# Altium footprint library Selex_PCBLib.PcbLib: 388 footprints (part 18 of 25)
Each footprint in its own frame and in the unit in brackets; x right, y up, seen from the top. Pads: shape width x height; smd on the part's side, far side on the other; paste and mask are expansions set on the pad; w line width, h text height; cw(c..) or ccw(c..) is an arc to the next point about the centre after c.
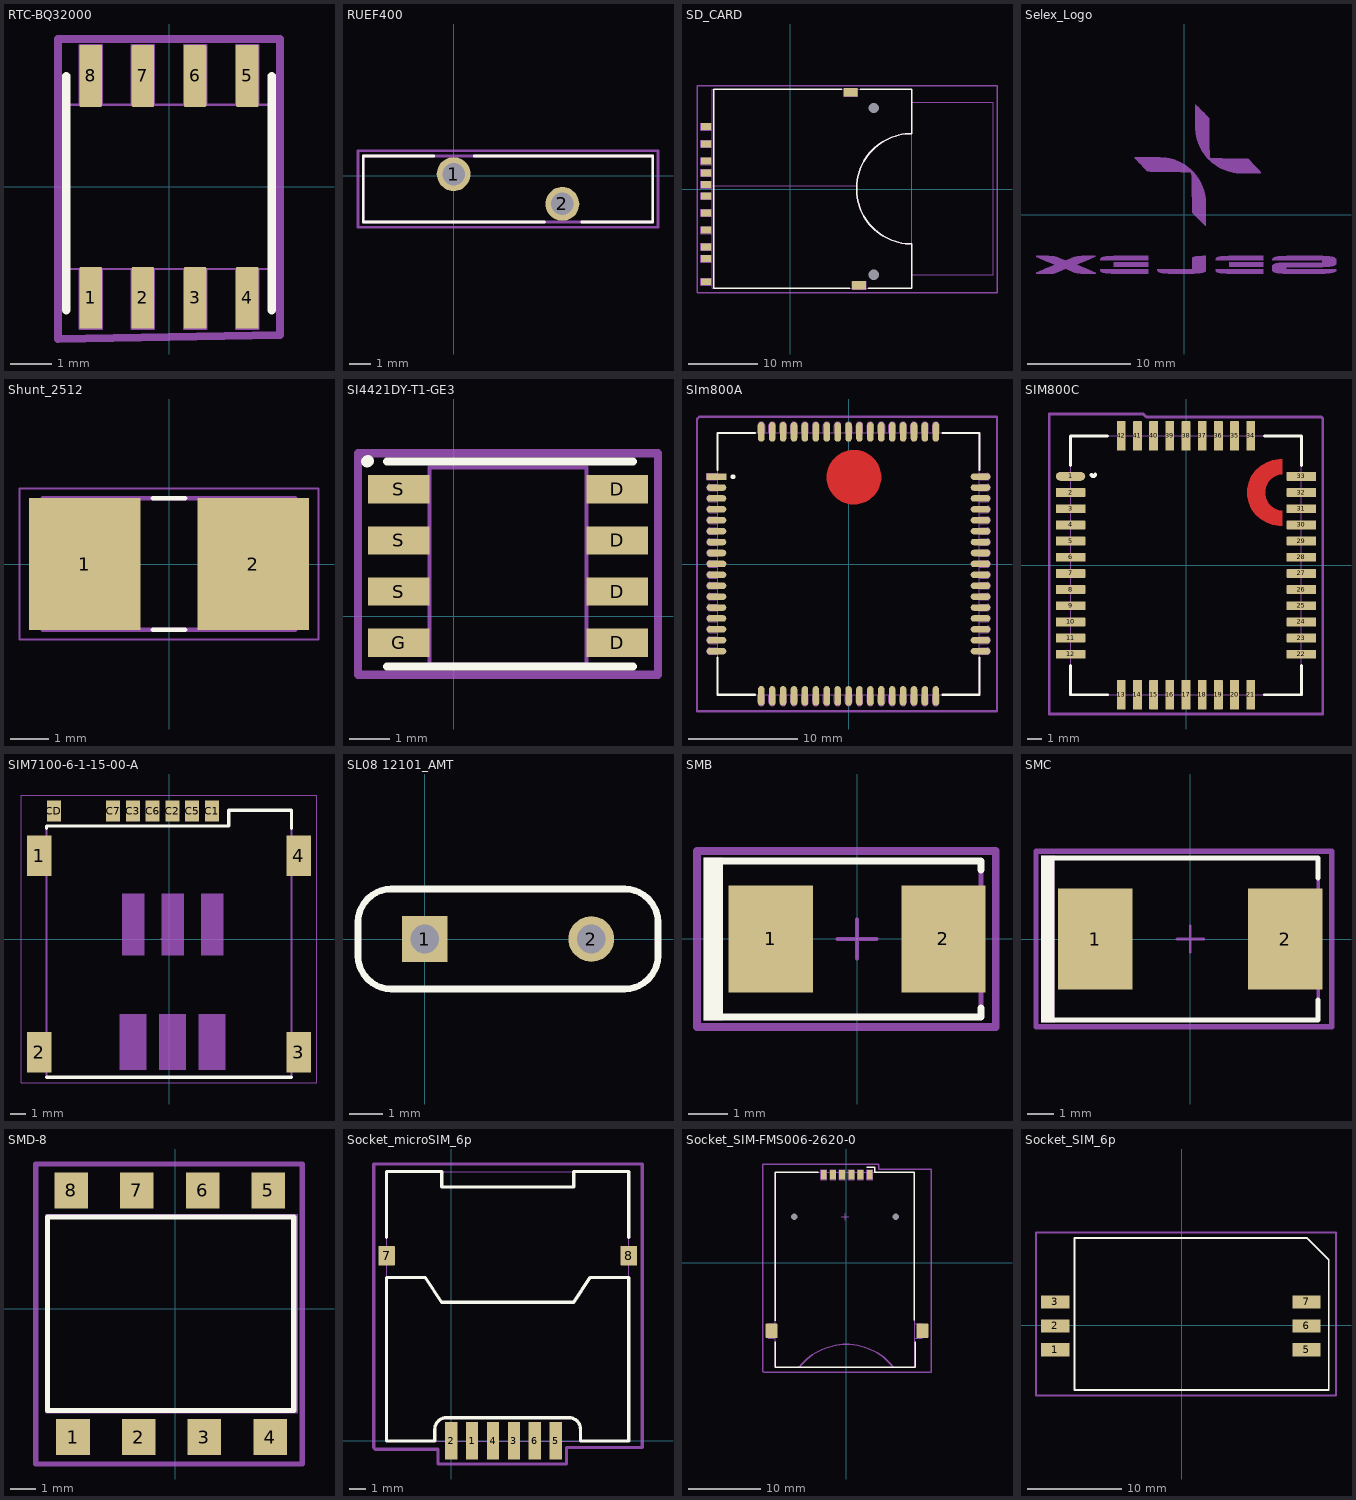
[diagram p17: the footprints below, top view; thin cyan lines are the x and y axes]

## RTC-BQ32000 [mm] "8-SOIC"
height 1.75
pads (8):
  rrect10% 0.55x1.5 smd mask+0.1: 1(-1.905,-2.7) 2(-0.635,-2.7) 3(0.635,-2.7) 4(1.905,-2.7) 5(1.905,2.7) 6(0.635,2.7) 7(-0.635,2.7) 8(-1.905,2.7)
Top Overlay:
  lines w0.2: -2.5,-3 -2.5,2.7 ; 2.5,-3 2.5,2.7
Mechanical 1:
  lines w0.05: -2.5,-0.78 -2.5,-2 2.5,-2 2.5,2 -2.5,2 -2.5,0.78 ; -2.18,-2 -2.18,-3.45 ; -1.63,-2.007 -1.63,-3.45 ; -0.91,-2.007 -0.91,-3.45 ; -0.91,2 -0.91,3.45 -0.36,3.45 -0.36,2 ; -0.36,-2 -0.36,-3.45 ; 0.36,-2 0.36,-3.45 ; 0.36,2.007 0.36,3.45 0.91,3.45 0.91,2 ; 0.91,-2 0.91,-3.45 ; 1.63,-2.007 1.63,-3.45 ; 1.63,2.007 1.63,3.45 2.18,3.45 2.18,2 ; 2.18,-2.007 2.18,-3.45 ; -2.18,-3.45 -1.63,-3.45 ; -2.18,-3.45 -1.63,-3.45 ; -2.18,-3.45 -1.63,-3.45 ; -2.18,-3.45 -1.63,-3.45 ; -2.18,2 -2.18,3.45 ; -2.18,2 -2.18,3.45 ; -2.18,2 -1.63,2 -1.63,3.45 ; -2.18,3.45 -1.63,3.45 ; -2.18,3.45 -1.63,3.45 ; -0.91,-3.45 -0.36,-3.45 ; -0.91,-3.45 -0.36,-3.45 ; 0.36,-3.45 0.91,-3.45 ; 0.36,-3.45 0.91,-3.45 ; 1.63,-3.45 2.18,-3.45 ; 1.63,-3.45 2.18,-3.45
Mechanical 3:
  lines w0.2: -2.7,-3.7 -2.7,0 -2.7,3.6 2.7,3.6 2.7,-3.6 -2.7,-3.7
3D body "PDSO-G8.step": height 1.75, standoff 0, extent -2.5,-3.131 2.5,3.131

## RUEF400 [mm]
pads (2):
  round 1.59 hole 1.06: 1(-0.008,0.069) 2(5.092,-1.331)
Top Overlay:
  lines w0.127: -0.948,0.919 -4.248,0.919 -4.248,-2.181 4.252,-2.181 ; 0.952,0.919 9.332,0.919 9.332,-2.181 6.002,-2.181
Mechanical 13:
  lines w0.127: -4.248,-2.181 9.332,-2.181 9.332,0.919 -4.248,0.919 -4.248,-2.181
Mechanical 15:
  lines w0.127: -4.498,-2.431 9.582,-2.431 9.582,1.169 -4.498,1.169 -4.498,-2.431

## SD_CARD [mm]
pads (15):
  rrect10% 1.5x1 smd mask+0.1: 1(-12.205,6.57) 2(-12.205,4.07) 3(-12.205,0.67) 4(-12.205,-0.98) 5(-12.205,-3.43) 6(-12.205,-5.93) 7(-12.205,-8.36) 8(-12.205,-10.06) 9(-12.205,9.07) CD(-12.205,2.37)
  rrect10% 2x1.2 smd mask+0.1: GND1(10.005,-13.93) GND2(8.805,14.07)
  round 0 hole 1.5 mask+0.1: HOLE(12.105,-12.38) HOLE1(12.105,11.77)
  rrect10% 1.5x1 smd: WP(-12.205,-13.41)
Top Overlay:
  lines w0.2: 7.495,14.52 -11.105,14.52 -11.105,-14.38 8.645,-14.38 ; 10.145,14.52 17.647,14.52 17.647,8.076 ccw(c17.647,0.07) 17.647,-7.936 17.647,-14.38 11.345,-14.38
Mechanical 1:
  lines w0.05: -11.253,0.47 9.645,0.47 ; 17.647,-12.41 29.447,-12.41 29.447,12.59 17.647,12.59 ; -12.955,-13.91 -12.955,-12.91 -11.455,-12.91 -11.455,-13.91 -12.955,-13.91 ; -12.955,-10.56 -11.455,-10.56 -11.455,-9.56 -12.955,-9.56 -12.955,-10.56 ; -12.955,-8.86 -11.455,-8.86 -11.455,-7.86 -12.955,-7.86 -12.955,-8.86 ; -12.955,-6.43 -11.455,-6.43 -11.455,-5.43 -12.955,-5.43 -12.955,-6.43 ; -12.955,-3.93 -11.455,-3.93 -11.455,-2.93 -12.955,-2.93 -12.955,-3.93 ; -12.955,-1.48 -11.455,-1.48 -11.455,-0.48 -12.955,-0.48 -12.955,-1.48 ; -12.955,0.17 -11.455,0.17 -11.455,1.17 -12.955,1.17 -12.955,0.17 ; -12.955,1.87 -11.455,1.87 -11.455,2.87 -12.955,2.87 -12.955,1.87 ; -12.955,3.57 -11.455,3.57 -11.455,4.57 -12.955,4.57 -12.955,3.57 ; -12.955,6.07 -11.455,6.07 -11.455,7.07 -12.955,7.07 -12.955,6.07 ; -12.955,8.57 -11.455,8.57 -11.455,9.57 -12.955,9.57 -12.955,8.57 ; -11.253,-14.38 -11.253,14.52 17.647,14.52 17.647,-14.38 -11.253,-14.38 ; 7.805,13.47 7.805,14.67 9.805,14.67 9.805,13.47 7.805,13.47 ; 9.005,-14.53 11.005,-14.53 11.005,-13.33 9.005,-13.33 9.005,-14.53
  lines w0.2: 17.647,-7.936 cw(c17.647,0.07) 17.647,8.076
  text "D1" at -10.705,-10.53 h1
  text "D0" at -10.705,-8.83 h1
  text "VSS2" at -10.705,-6.43 h1
  text "CLK" at -10.705,-3.93 h1
  text "VDD" at -10.705,-1.48 h1
  text "VSS1" at -10.705,0.22 h1
  text "CMD" at -10.705,3.57 h1
  text "D3" at -10.705,6.07 h1
  text "D2" at -10.705,8.57 h1
Mechanical 15:
  lines w0.2: -13.5,-15 -13.5,15 11.7,15 30,15 30,-15 -13.5,-15
3D body "SDCARDb.stp": height 2.8, standoff -0.8, extent -12.675,-14.13 17.575,14.32

## Selex_Logo [mm]
Bottom Overlay:
  drawing of 854 lines, arcs and shapes, not listed

## Shunt_2512 [mm]
pads (2):
  rect 2.91x3.44 smd: 1(-2.201,0) 2(2.201,0)
Top Overlay:
  lines w0.127: -0.42,-1.72 0.42,-1.72 ; -0.42,1.72 0.42,1.72
Mechanical 13:
  lines w0.127: -3.3,-1.72 -3.3,1.72 3.3,1.72 3.3,-1.72 -3.3,-1.72
Mechanical 15:
  lines w0.05: -3.906,-1.971 -3.906,1.971 3.906,1.971 3.906,-1.971 -3.906,-1.971

## SI4421DY-T1-GE3 [mm]
pads (8):
  rect 1.525x0.7 smd: D(4.062,-0.655) D(4.062,0.615) D(4.062,1.885) D(4.062,3.155) G(-1.362,-0.655) S(-1.362,0.615) S(-1.362,1.885) S(-1.362,3.155)
Top Overlay:
  lines w0.2: -1.65,-1.25 4.45,-1.25 ; -1.65,3.85 4.45,3.85
  lines w0.3: -2.15,3.85 -2.125,3.855
Mechanical 13:
  lines w0.1: -0.6,-1.2 3.3,-1.2 3.3,3.7 -0.6,3.7 -0.6,-1.2
Mechanical 15:
  lines w0.2: -2.375,-1.45 5.075,-1.45 5.075,4.05 -2.375,4.05 -2.375,-1.45
3D body "MP9486GN.stp": height 0, standoff 0, extent 1.35,1.25 1.35,1.25

## SIm800A [mm]
pads (68):
  rrect10% 1.8x0.6 smd mask+0.05: 1(-12.11,8.01)
  oval 1.8x0.6 smd mask+0.05: 2(-12.11,7.01) 3(-12.11,6.01) 4(-12.11,5.01) 5(-12.11,4.01) 6(-12.11,3.01) 7(-12.11,2.01) 8(-12.11,1.01) 9(-12.11,0.01) 10(-12.11,-0.99) 11(-12.11,-1.99) 12(-12.11,-2.99) 13(-12.11,-3.99) 14(-12.11,-4.99) 15(-12.11,-5.99) 16(-12.11,-6.99) 17(-12.11,-7.99) 35(12.09,-7.99) 36(12.09,-6.99) 37(12.09,-5.99) 38(12.09,-4.99) 39(12.09,-3.99) 40(12.09,-2.99) 41(12.09,-1.99) 42(12.09,-0.99) 43(12.09,0.01) 44(12.09,1.01) 45(12.09,2.01) 46(12.09,3.01) 47(12.09,4.01) 48(12.09,5.01) 49(12.09,6.01) 50(12.09,7.01) 51(12.09,8.01)
  oval 0.6x1.8 smd mask+0.05: 18(-8.01,-12.09) 19(-7.01,-12.09) 20(-6.01,-12.09) 21(-5.01,-12.09) 22(-4.01,-12.09) 23(-3.01,-12.09) 24(-2.01,-12.09) 25(-1.01,-12.09) 26(-0.01,-12.09) 27(0.99,-12.09) 28(1.99,-12.09) 29(2.99,-12.09) 30(3.99,-12.09) 31(4.99,-12.09) 32(5.99,-12.09) 33(6.99,-12.09) 34(7.99,-12.09) 52(7.99,12.11) 53(6.99,12.11) 54(5.99,12.11) 55(4.99,12.11) 56(3.99,12.11) 57(2.99,12.11) 58(1.99,12.11) 59(0.99,12.11) 60(-0.01,12.11) 61(-1.01,12.11) 62(-2.01,12.11) 63(-3.01,12.11) 64(-4.01,12.11) 65(-5.01,12.11) 66(-6.01,12.11) 67(-7.01,12.11) 68(-8.01,12.11)
Top Layer:
  circle w3: c0.49,7.96 r1
Top Overlay:
  circle w0.2: c-10.6,8 r0.127
  lines w0.2: -12.01,-8.59 -12.01,-11.99 -8.61,-11.99 ; -12.01,8.646 -12.01,12.01 -8.61,12.01 ; 8.59,-11.99 11.99,-11.99 11.99,-8.59 ; 8.59,12.01 11.99,12.01 11.99,8.61
Mechanical 1:
  drawing of 345 lines, arcs and shapes, not listed
  text "17" at -10.81,-8.372 h1.2
  text "18" at -8.41,-10.79 h1.2
  text "34" at 7.61,-10.79 h1.2
  text "35" at 9.89,-8.372 h1.2
  text "51" at 9.89,7.63 h1.2
  text "52" at 7.59,10.11 h1.2
  text "68" at -8.646,10.11 h1.2
  text "1" at -10.51,7.66 h1.2
Mechanical 15:
  lines w0.2: -13.9,-13.5 13.6,-13.5 13.6,13.5 -13.7,13.5 -13.9,13.3 -13.9,9.5 -13.9,-13.5
3D body "SIM900.step": height 3.02, standoff 0, extent -12.01,-11.99 11.99,12.01

## SIM800C [mm]
pads (42):
  oval 2x0.6 smd mask+0.05: 1(-7.85,6.06)
  rrect10% 2x0.6 smd mask+0.05: 2(-7.85,4.96) 3(-7.85,3.86) 4(-7.85,2.76) 5(-7.85,1.66) 6(-7.85,0.56) 7(-7.85,-0.54) 8(-7.85,-1.64) 9(-7.85,-2.74) 10(-7.85,-3.84) 11(-7.85,-4.94) 12(-7.85,-6.04) 22(7.85,-6.04) 23(7.85,-4.94) 24(7.85,-3.84) 25(7.85,-2.74) 26(7.85,-1.64) 27(7.85,-0.54) 28(7.85,0.56) 29(7.85,1.66) 30(7.85,2.76) 31(7.85,3.86) 32(7.85,4.96) 33(7.85,6.06)
  rrect10% 0.6x2 smd mask+0.05: 13(-4.4,-8.79) 14(-3.3,-8.79) 15(-2.2,-8.79) 16(-1.1,-8.79) 17(0,-8.79) 18(1.1,-8.79) 19(2.2,-8.79) 20(3.3,-8.79) 21(4.4,-8.79) 34(4.4,8.81) 35(3.3,8.81) 36(2.2,8.81) 37(1.1,8.81) 38(0,8.81) 39(-1.1,8.81) 40(-2.2,8.81) 41(-3.3,8.81) 42(-4.4,8.81)
Top Layer:
  region: 6.55,3.71 6.433,3.721 6.204,3.776 5.99,3.875 5.8,4.014 5.641,4.187 5.518,4.388 5.437,4.61 5.401,4.842 5.4,4.96 5.401,5.078 5.437,5.31 5.518,5.532 5.641,5.733 5.8,5.906 5.99,6.045 6.204,6.144 6.433,6.199 6.55,6.21 6.55,7.21 6.321,7.217 5.869,7.143 5.44,6.981 5.051,6.739 4.717,6.425 4.45,6.053 4.261,5.635 4.157,5.189 4.15,4.96 4.157,4.731 4.261,4.285 4.45,3.867 4.717,3.495 5.051,3.181 5.44,2.939 5.869,2.777 6.321,2.703 6.55,2.71
Top Overlay:
  lines w0.2: -7.85,-6.79 -7.85,-8.79 -5.35,-8.79 ; -7.85,6.81 -7.85,8.81 -5.35,8.81 ; 5.35,-8.79 7.85,-8.79 7.85,-6.79 ; 5.35,8.81 7.85,8.81 7.85,6.81
  lines w0.254: -6.425,6.177 ccw(c-6.3,6.2) -6.173,6.2
Mechanical 1:
  lines w0.05: -7.85,-8.79 -7.85,8.81 7.85,8.81 7.85,-8.79 -7.85,-8.79
Mechanical 15:
  lines w0.2: -9.3,-10.1 -9.3,6 -9.3,10.3 -2.9,10.3 -2.7,10.1 9.2,10.1 9.3,10 9.3,-10.1 -0.8,-10.1 -9.3,-10.1
3D body "User Library-SIM800C.step": height 2.3, standoff -0.01, extent -7.85,-8.79 7.85,8.81

## SIM7100-6-1-15-00-A [mm]
pads (11):
  rect 1.56x2.61 smd: 1(-8.34,5.34) 2(-8.34,-7.29) 3(8.34,-7.29) 4(8.34,5.34)
  rect 0.9x1.35 smd: C1(2.755,8.215) C2(0.215,8.215) C3(-2.325,8.215) C5(1.485,8.215) C6(-1.055,8.215) C7(-3.595,8.215) CD(-7.405,8.215)
Top Overlay:
  lines w0.2: -7.875,-8.89 7.875,-8.89 ; -7.875,7.1 -7.875,7.27 3.84,7.27 3.84,8.28 7.875,8.28 7.875,7.1
Mechanical 13:
  lines w0.1: -7.875,-8.89 -7.875,7.27 3.84,7.27 3.84,8.28 7.875,8.28 7.875,-8.89 -7.875,-8.89
Mechanical 15:
  region: 0.935,-1.03 -0.465,-1.03 -0.465,2.91 0.935,2.91
  region: 3.625,-8.41 1.925,-8.41 1.925,-4.83 3.625,-4.83
  region: 3.475,-1.03 2.075,-1.03 2.075,2.91 3.475,2.91
  region: 1.085,-8.41 -0.615,-8.41 -0.615,-4.83 1.085,-4.83
  region: -1.455,-8.41 -3.155,-8.41 -3.155,-4.83 -1.455,-4.83
  region: -1.605,-1.03 -3.005,-1.03 -3.005,2.91 -1.605,2.91
  lines w0.05: -9.5,-9.25 -9.5,9.25 9.5,9.25 9.5,-9.25 -9.5,-9.25
  lines w0.1: -0.5,0 0.5,0 ; 0,-0.5 0,0.5
3D body "SIM7100-6-1-15-00-A--3DModel-STEP-56544.STEP": height 1.5, standoff -0.03, extent -8.375,-8.665 8.375,8.665

## SL08 12101_AMT [mil]
pads (2):
  rect 54x54 hole 34 mask-1000: 1(0,0)
  round 54 hole 34 mask-1000: 2(196.85,0)
Top Overlay:
  lines w7.87: -78.74,-19.68 ccw(c-39.37,-19.68) -39.37,-59.06 236.22,-59.06 ccw(c236.22,-19.68) 275.59,-19.69 275.59,19.68 ccw(c236.22,19.68) 236.22,59.06 -39.37,59.06 ccw(c-39.37,19.68) -78.74,19.69 -78.74,-19.68

## SMB [mm]
pads (2):
  rect 2.159x2.743 smd: 1(-2.21,0) 2(2.21,0)
Top Overlay:
  rectangle: -3.937,-2.083 -3.429,2.083
  lines w0.178: -3.607,-1.994 3.175,-1.994 3.175,-1.765 ; -3.607,1.994 3.175,1.994 3.175,1.765
Mechanical 5:
  rectangle: -3.937,-2.083 -3.429,2.083
  lines w0.127: -3.607,-1.994 3.175,-1.994 3.175,-1.765 3.175,1.765 3.175,1.994 -3.607,1.994
  text ".Designator" at -2.311,-0.508 h1.02
Mechanical 15:
  lines w0.1: -0.5,0 0.5,0 ; 0,-0.5 0,0.5
  lines w0.2: -4.1,-2.25 -4.1,2.25 3.55,2.25 3.55,-2.25 -4.1,-2.25
3D body "SMB_nominal.stp": height 2.32, standoff 0.02, extent -2.7,-1.8 2.7,1.8

## SMC [mil]
pads (2):
  rect 110x150 smd: 1(-140.49,0) 2(140.49,0)
Top Overlay:
  rectangle: -220.99,-123.5 -200.99,123.5
  lines w7: -210,-120 189,-120 189,-90.25 ; -210,120 189,120 189,90.25
Mechanical 5:
  rectangle: -220.99,-123.5 -200.99,123.5
  lines w5: -210,-120 189,-120 189,120 -210,120
  text ".Designator" at -85,-20 h40
Mechanical 15:
  lines w3.94: -19.69,0 19.68,0 ; 0,-19.68 0,19.68
  lines w7.87: -228.35,-129.92 209.38,-129.92 209.38,129.92 -228.35,129.92 -228.35,-129.92
3D body "SMC_nominal.stp": height 91.25, standoff 0.6, extent -156.49,-116.14 156.5,116.14

## SMD-8 [mm]
pads (8):
  rect 1.3x1.4 smd: 1(-3.96,-4.96) 2(-1.42,-4.96) 3(1.12,-4.96) 4(3.66,-4.96) 5(3.59,4.58) 6(1.05,4.58) 7(-1.49,4.58) 8(-4.03,4.58)
Top Overlay:
  lines w0.2: -4.953,-3.937 4.572,-3.937 4.572,3.556 -4.953,3.556 -4.953,-3.937
Mechanical 13:
  lines w0.1: 4.68,-3.98 4.68,3.62 -5,3.62 -5,-4 4.69,-4
Mechanical 15:
  lines w0.2: -5.4,-6 4.9,-6 4.9,5.6 -5.4,5.6 -5.4,-6
3D body "User Library-SMD-8C.STEP": height 4.2, standoff 0.2, extent -5.15,-5.1 4.7,4.7

## Socket_microSIM_6p [mm]
pads (8):
  rrect10% 0.75x2.3 smd mask+0.05: 1(1.27,0.01) 2(0,0.01) 3(3.81,0.01) 4(2.54,0.01) 5(6.35,0.01) 6(5.08,0.01)
  rrect10% 1x1.2 smd mask+0.05: 7(-3.92,11.24) 8(10.78,11.24)
Top Overlay:
  lines w0.2: -3.92,12.34 -3.92,16.34 -0.57,16.34 -0.57,15.41 7.43,15.41 7.43,16.34 10.78,16.34 10.78,12.34 ; -3.92,-0.01 -0.99,-0.01 -0.99,0.71 cw(c-0.29,0.71) -0.29,1.41 0.43,1.41 6.43,1.41 7.15,1.41 cw(c7.15,0.71) 7.85,0.71 7.85,-0.01 10.78,-0.01 10.78,9.91 8.43,9.91 7.43,8.41 3.43,8.41 -0.57,8.41 -1.57,9.91 -3.92,9.91 -3.92,-0.01
Mechanical 1:
  lines w0.05: -3.92,-0.01 -3.92,16.34 10.78,16.34 10.78,-0.01 -3.92,-0.01
Mechanical 15:
  lines w0.2: -4.7,16.7 -4.7,16.6 ; -4.7,16.6 -4.7,-0.4 -4.6,-0.5 -0.8,-0.5 -0.8,-1.4 4.4,-1.4 7,-1.4 7,-0.4 11.1,-0.4 11.6,-0.4 11.6,16.8 -4.7,16.8 -4.7,16.6
3D body: height 1.75, standoff 0, extent -3.97,-0.075 10.83,16.325

## Socket_SIM-FMS006-2620-0 [mm]
pads (10):
  rrect10% 0.8x1.35 smd mask+0.1: 1(3.24,12.105) 2(0.7,12.105) 3(-1.84,12.105) 5(1.97,12.105) 6(-0.57,12.105) 7(-3.11,12.105)
  rrect10% 0x0 hole 0.9 mask+0.1: HOLE1(-7.16,6.33) HOLE2(6.84,6.33)
  rrect10% 1.6x2 smd mask+0.1: PAD1(-10.3,-9.4) PAD2(10.5,-9.4)
Top Overlay:
  lines w0.2: -9.8,-10.92 -9.8,-14.42 9.5,-14.42 9.5,-10.92 ; -9.8,-8.02 -9.8,12.43 -3.86,12.43 ; 2.84,13.13 3.94,13.13 3.94,12.43 9.4,12.43 9.4,-7.92
Mechanical 1:
  lines w0.05: -9.76,-10.42 -10.76,-10.42 -10.76,-8.42 -9.76,-8.42 ; -0.66,6.33 0.34,6.33 ; -0.16,5.83 -0.16,6.83 ; 9.44,-10.42 10.44,-10.42 ; 9.44,-8.42 10.44,-8.42 ; 10.44,-10.42 10.44,-8.42 ; 10.44,-10.42 10.44,-8.42 ; -9.76,-14.42 -9.76,12.43 9.44,12.43 9.44,-14.42 -9.76,-14.42 ; -3.51,11.43 -2.71,11.43 -2.71,12.78 -3.51,12.78 -3.51,11.43 ; -2.24,11.43 -1.44,11.43 -1.44,12.78 -2.24,12.78 -2.24,11.43 ; -0.97,11.43 -0.17,11.43 -0.17,12.78 -0.97,12.78 -0.97,11.43 ; 0.3,11.43 1.1,11.43 1.1,12.78 0.3,12.78 0.3,11.43 ; 1.57,11.43 2.37,11.43 2.37,12.78 1.57,12.78 1.57,11.43 ; 2.84,11.43 2.84,12.78 3.64,12.78 3.64,11.43 2.84,11.43
  lines w0.2: -6.462,-14.39 cw(c0.009,-19.501) 6.479,-14.389
  text "J?" at -0.16,6.33 h1
  text "1" at 3.34,9.83 h1
  text "5" at 1.94,9.83 h1
  text "2" at 0.54,9.83 h1
  text "6" at -0.86,9.83 h1
  text "3" at -2.26,9.83 h1
  text "7" at -3.66,9.83 h1
Mechanical 15:
  lines w0.2: -11.5,-15 -11.4,-15.1 11.7,-15.1 11.7,12.9 4.5,12.9 4.5,13.6 4.2,13.6 2.9,13.6 -11.5,13.6 -11.5,-15
3D body "fms0062620.step": height 2.4, standoff 0, extent -10.745,-14.72 11.265,11.78

## Socket_SIM_6p [mm]
pads (6):
  rect 3x1.4 smd: 1(-13.445,-2.62) 2(-13.445,-0.08) 3(-13.445,2.46) 5(13.225,-2.62) 6(13.225,-0.08) 7(13.225,2.46)
Top Overlay:
  lines w0.2: -11.395,-6.87 15.59,-6.87 15.59,6.945 13.305,9.23 -11.395,9.23 -11.395,-6.87
Mechanical 15:
  lines w0.2: -15.5,-7.47 16.355,-7.47 16.355,9.83 -15.5,9.83 -15.5,3.82 -15.5,-7.47
3D body "SW3dPS-SIMLOCK-1.STEP": height 2.6, standoff 0.1, extent -13.645,-7.495 16.355,9.805